# Altium footprint library 7-Connectors-7.PcbLib: 35 footprints (part 3 of 4)
Each footprint in its own frame and in the unit in brackets; x right, y up, seen from the top. Pads: shape width x height; smd on the part's side, far side on the other; paste and mask are expansions set on the pad; w line width, h text height; cw(c..) or ccw(c..) is an arc to the next point about the centre after c.
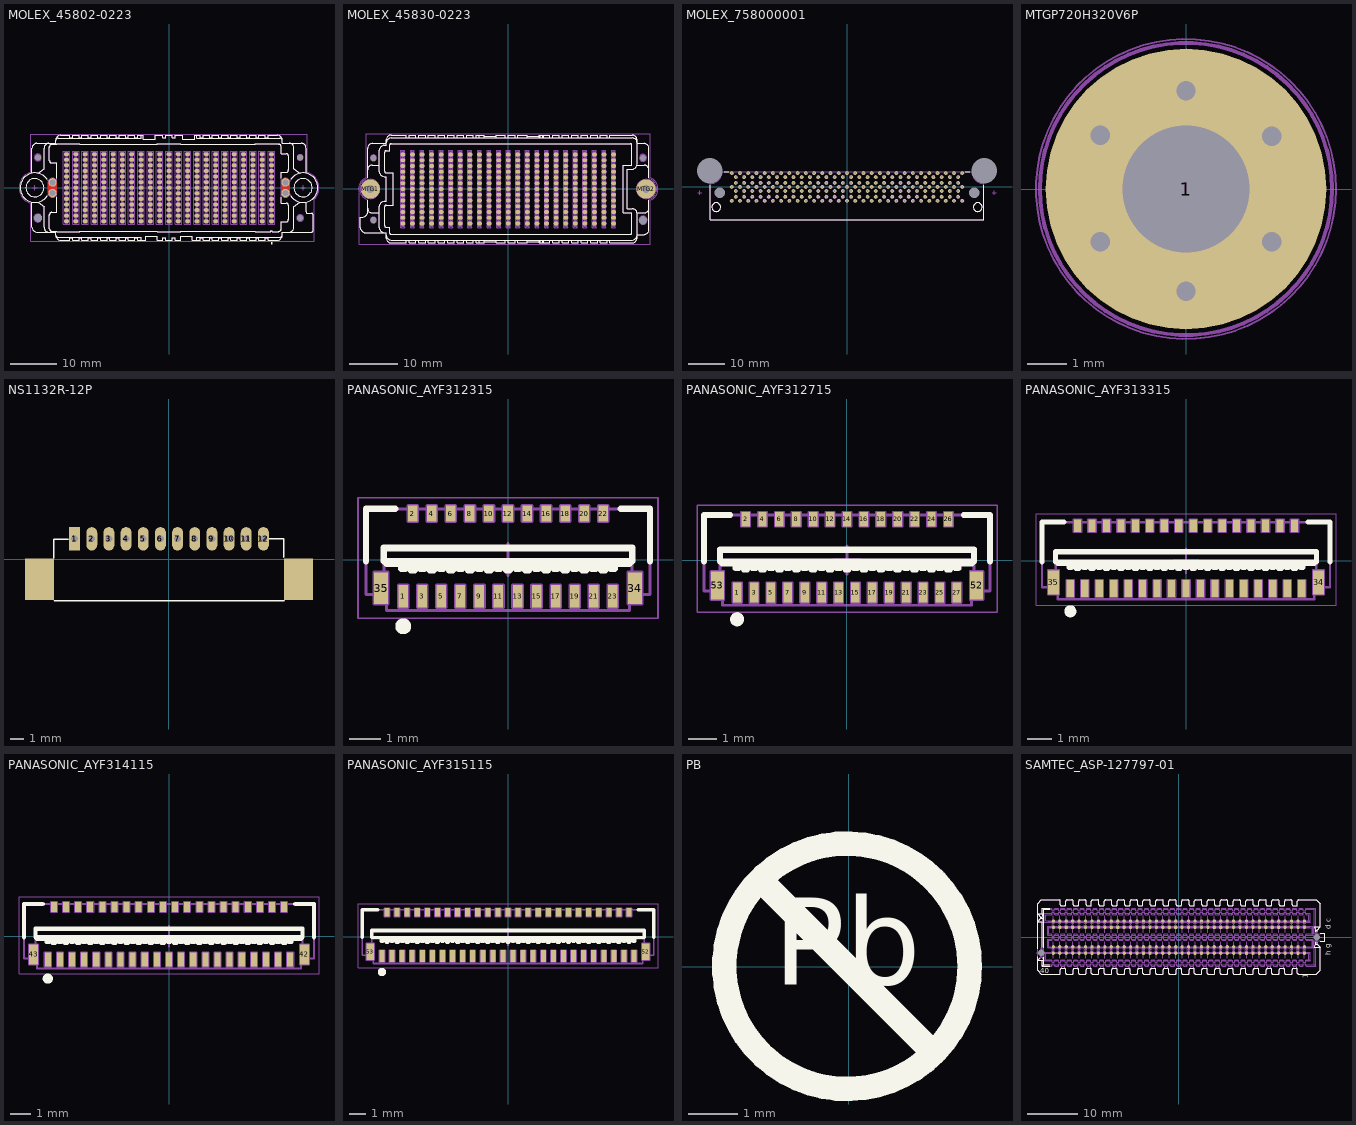
[diagram p2: the footprints below, top view; thin cyan lines are the x and y axes]

## MOLEX_45802-0223 [mm] "1.20mm by 2.00mm Pitch HD Mezzanine Receptacle, 299 Circuits, 8.00mm Unmated Height, 23 Rows"
height 10.51
pads (307):
  rrect100% 1x0.8 smd: 1A(22,-7.2) 1B(22,-6) 1C(22,-4.8) 1D(22,-3.6) 1E(22,-2.4) 1F(22,-1.2) 1G(22,0) 1H(22,1.2) 1I(22,2.4) 1J(22,3.6) 1K(22,4.8) 1L(22,6) 1M(22,7.2) 2A(20,-7.2) 2B(20,-6) 2C(20,-4.8) 2D(20,-3.6) 2E(20,-2.4) 2F(20,-1.2) 2G(20,0) 2H(20,1.2) 2I(20,2.4) 2J(20,3.6) 2K(20,4.8) 2L(20,6) 2M(20,7.2) 3A(18,-7.2) 3B(18,-6) 3C(18,-4.8) 3D(18,-3.6) 3E(18,-2.4) 3F(18,-1.2) 3G(18,0) 3H(18,1.2) 3I(18,2.4) 3J(18,3.6) 3K(18,4.8) 3L(18,6) 3M(18,7.2) 4A(16,-7.2) 4B(16,-6) 4C(16,-4.8) 4D(16,-3.6) 4E(16,-2.4) 4F(16,-1.2) 4G(16,0) 4H(16,1.2) 4I(16,2.4) 4J(16,3.6) 4K(16,4.8) 4L(16,6) 4M(16,7.2) 5A(14,-7.2) 5B(14,-6) 5C(14,-4.8) 5D(14,-3.6) 5E(14,-2.4) 5F(14,-1.2) 5G(14,0) 5H(14,1.2) 5I(14,2.4) 5J(14,3.6) 5K(14,4.8) 5L(14,6) 5M(14,7.2) 6A(12,-7.2) 6B(12,-6) 6C(12,-4.8) 6D(12,-3.6) 6E(12,-2.4) 6F(12,-1.2) 6G(12,0) 6H(12,1.2) 6I(12,2.4) 6J(12,3.6) 6K(12,4.8) 6L(12,6) 6M(12,7.2) 7A(10,-7.2) 7B(10,-6) 7C(10,-4.8) 7D(10,-3.6) 7E(10,-2.4) 7F(10,-1.2) 7G(10,0) 7H(10,1.2) 7I(10,2.4) 7J(10,3.6) 7K(10,4.8) 7L(10,6) 7M(10,7.2) 8A(8,-7.2) 8B(8,-6) 8C(8,-4.8) 8D(8,-3.6) 8E(8,-2.4) 8F(8,-1.2) 8G(8,0) 8H(8,1.2) 8I(8,2.4) 8J(8,3.6) 8K(8,4.8) 8L(8,6) 8M(8,7.2) 9A(6,-7.2) 9B(6,-6) 9C(6,-4.8) 9D(6,-3.6) 9E(6,-2.4) 9F(6,-1.2) 9G(6,0) 9H(6,1.2) 9I(6,2.4) 9J(6,3.6) 9K(6,4.8) 9L(6,6) 9M(6,7.2) 10A(4,-7.2) 10B(4,-6) 10C(4,-4.8) 10D(4,-3.6) 10E(4,-2.4) 10F(4,-1.2) 10G(4,0) 10H(4,1.2) 10I(4,2.4) 10J(4,3.6) 10K(4,4.8) 10L(4,6) 10M(4,7.2) 11A(2,-7.2) 11B(2,-6) 11C(2,-4.8) 11D(2,-3.6) 11E(2,-2.4) 11F(2,-1.2) 11G(2,0) 11H(2,1.2) 11I(2,2.4) 11J(2,3.6) 11K(2,4.8) 11L(2,6) 11M(2,7.2) 12A(0,-7.2) 12B(0,-6) 12C(0,-4.8) 12D(0,-3.6) 12E(0,-2.4) 12F(0,-1.2) 12G(0,0) 12H(0,1.2) 12I(0,2.4) 12J(0,3.6) 12K(0,4.8) 12L(0,6) 12M(0,7.2) 13A(-2,-7.2) 13B(-2,-6) 13C(-2,-4.8) 13D(-2,-3.6) 13E(-2,-2.4) 13F(-2,-1.2) 13G(-2,0) 13H(-2,1.2) 13I(-2,2.4) 13J(-2,3.6) 13K(-2,4.8) 13L(-2,6) 13M(-2,7.2) 14A(-4,-7.2) 14B(-4,-6) 14C(-4,-4.8) 14D(-4,-3.6) 14E(-4,-2.4) 14F(-4,-1.2) 14G(-4,0) 14H(-4,1.2) 14I(-4,2.4) 14J(-4,3.6) 14K(-4,4.8) 14L(-4,6) 14M(-4,7.2) 15A(-6,-7.2) 15B(-6,-6) 15C(-6,-4.8) 15D(-6,-3.6) 15E(-6,-2.4) 15F(-6,-1.2) 15G(-6,0) 15H(-6,1.2) 15I(-6,2.4) 15J(-6,3.6) 15K(-6,4.8) 15L(-6,6) 15M(-6,7.2) 16A(-8,-7.2) 16B(-8,-6) 16C(-8,-4.8) 16D(-8,-3.6) 16E(-8,-2.4) 16F(-8,-1.2) 16G(-8,0) 16H(-8,1.2) 16I(-8,2.4) 16J(-8,3.6) 16K(-8,4.8) 16L(-8,6) 16M(-8,7.2) 17A(-10,-7.2) 17B(-10,-6) 17C(-10,-4.8) 17D(-10,-3.6) 17E(-10,-2.4) 17F(-10,-1.2) 17G(-10,0) 17H(-10,1.2) 17I(-10,2.4) 17J(-10,3.6) 17K(-10,4.8) 17L(-10,6) 17M(-10,7.2) 18A(-12,-7.2) 18B(-12,-6) 18C(-12,-4.8) 18D(-12,-3.6) 18E(-12,-2.4) 18F(-12,-1.2) 18G(-12,0) 18H(-12,1.2) 18I(-12,2.4) 18J(-12,3.6) 18K(-12,4.8) 18L(-12,6) 18M(-12,7.2) 19A(-14,-7.2) 19B(-14,-6) 19C(-14,-4.8) 19D(-14,-3.6) 19E(-14,-2.4) 19F(-14,-1.2) 19G(-14,0) 19H(-14,1.2) 19I(-14,2.4) 19J(-14,3.6) 19K(-14,4.8) 19L(-14,6) 19M(-14,7.2) 20A(-16,-7.2) 20B(-16,-6) 20C(-16,-4.8) 20D(-16,-3.6) 20E(-16,-2.4) 20F(-16,-1.2) 20G(-16,0) 20H(-16,1.2) 20I(-16,2.4) 20J(-16,3.6) 20K(-16,4.8) 20L(-16,6) 20M(-16,7.2) 21A(-18,-7.2) 21B(-18,-6) 21C(-18,-4.8) 21D(-18,-3.6) 21E(-18,-2.4) 21F(-18,-1.2) 21G(-18,0) 21H(-18,1.2) 21I(-18,2.4) 21J(-18,3.6) 21K(-18,4.8) 21L(-18,6) 21M(-18,7.2) 22A(-20,-7.2) 22B(-20,-6) 22C(-20,-4.8) 22D(-20,-3.6) 22E(-20,-2.4) 22F(-20,-1.2) 22G(-20,0) 22H(-20,1.2) 22I(-20,2.4) 22J(-20,3.6) 22K(-20,4.8) 22L(-20,6) 22M(-20,7.2) 23A(-22,-7.2) 23B(-22,-6) 23C(-22,-4.8) 23D(-22,-3.6) 23E(-22,-2.4) 23F(-22,-1.2) 23G(-22,0) 23H(-22,1.2) 23I(-22,2.4) 23J(-22,3.6) 23K(-22,4.8) 23L(-22,6) 23M(-22,7.2)
  round 1 hole 1.75 unplated mask+0.375: MTG1(-28.15,-6.5)
  round 1 hole 1.25 unplated mask+0.125: MTG2(-28.15,6.5) MTG3(28.15,6.5) MTG4(28.15,-6.5)
  round 1.8 hole 1.3: MTG5(-25,1.15) MTG6(-25,-1.15) MTG7(25,1.15) MTG8(25,-1.15)
Top Layer:
  region: 24.1,-1.15 24.1,1.15 24.1,1.268 24.161,1.497 24.28,1.703 24.447,1.87 24.653,1.989 24.882,2.05 25.118,2.05 25.347,1.989 25.553,1.87 25.72,1.703 25.839,1.497 25.9,1.268 25.9,1.15 25.9,-1.15 25.9,-1.268 25.839,-1.497 25.72,-1.703 25.553,-1.87 25.347,-1.989 25.118,-2.05 24.882,-2.05 24.653,-1.989 24.447,-1.87 24.28,-1.703 24.161,-1.497 24.1,-1.268
  region: -25.9,-1.15 -25.9,1.15 -25.9,1.268 -25.839,1.497 -25.72,1.703 -25.553,1.87 -25.347,1.989 -25.119,2.05 -24.882,2.05 -24.653,1.989 -24.447,1.87 -24.28,1.703 -24.161,1.497 -24.1,1.268 -24.1,1.15 -24.1,-1.15 -24.1,-1.268 -24.161,-1.497 -24.28,-1.703 -24.447,-1.87 -24.653,-1.989 -24.882,-2.05 -25.119,-2.05 -25.347,-1.989 -25.553,-1.87 -25.72,-1.703 -25.839,-1.497 -25.9,-1.268
Bottom Layer:
  region: 24.1,-1.15 24.1,1.15 24.1,1.268 24.161,1.497 24.28,1.703 24.447,1.87 24.653,1.989 24.882,2.05 25.118,2.05 25.347,1.989 25.553,1.87 25.72,1.703 25.839,1.497 25.9,1.268 25.9,1.15 25.9,-1.15 25.9,-1.268 25.839,-1.497 25.72,-1.703 25.553,-1.87 25.347,-1.989 25.118,-2.05 24.882,-2.05 24.653,-1.989 24.447,-1.87 24.28,-1.703 24.161,-1.497 24.1,-1.268
  region: -25.9,-1.15 -25.9,1.15 -25.9,1.268 -25.839,1.497 -25.72,1.703 -25.553,1.87 -25.347,1.989 -25.119,2.05 -24.882,2.05 -24.653,1.989 -24.447,1.87 -24.28,1.703 -24.161,1.497 -24.1,1.268 -24.1,1.15 -24.1,-1.15 -24.1,-1.268 -24.161,-1.497 -24.28,-1.703 -24.447,-1.87 -24.653,-1.989 -24.882,-2.05 -25.119,-2.05 -25.347,-1.989 -25.553,-1.87 -25.72,-1.703 -25.839,-1.497 -25.9,-1.268
Top Overlay:
  drawing of 357 lines, arcs and shapes, not listed
Mechanical 8:
  drawing of 2456 lines, arcs and shapes, not listed
Mechanical 14:
  drawing of 495 lines, arcs and shapes, not listed
Mechanical 15:
  lines w0.05: -29.665,-11.5 -29.665,-3.302 cw(c-28.775,0) -29.665,3.302 -29.665,11.5 29.665,11.5 29.665,3.302 cw(c28.775,0) 31.165,-2.446 31.165,-11.5 -29.665,-11.5
3D body "MOLEX_45802-0223.stp": height 10.51, standoff -1.99, extent -31.945,-11.25 31.945,11.25

## MOLEX_45830-0223 [mm] "1.20mm by 2.00mm Pitch HD Mezzanine Plug, 299 Circuits, 8.00mm Unmated Height, 23 Rows"
height 10.41
pads (305):
  rrect100% 1x0.8 smd: 1A(-22,-7.2) 1B(-22,-6) 1C(-22,-4.8) 1D(-22,-3.6) 1E(-22,-2.4) 1F(-22,-1.2) 1G(-22,0) 1H(-22,1.2) 1I(-22,2.4) 1J(-22,3.6) 1K(-22,4.8) 1L(-22,6) 1M(-22,7.2) 2A(-20,-7.2) 2B(-20,-6) 2C(-20,-4.8) 2D(-20,-3.6) 2E(-20,-2.4) 2F(-20,-1.2) 2G(-20,0) 2H(-20,1.2) 2I(-20,2.4) 2J(-20,3.6) 2K(-20,4.8) 2L(-20,6) 2M(-20,7.2) 3A(-18,-7.2) 3B(-18,-6) 3C(-18,-4.8) 3D(-18,-3.6) 3E(-18,-2.4) 3F(-18,-1.2) 3G(-18,0) 3H(-18,1.2) 3I(-18,2.4) 3J(-18,3.6) 3K(-18,4.8) 3L(-18,6) 3M(-18,7.2) 4A(-16,-7.2) 4B(-16,-6) 4C(-16,-4.8) 4D(-16,-3.6) 4E(-16,-2.4) 4F(-16,-1.2) 4G(-16,0) 4H(-16,1.2) 4I(-16,2.4) 4J(-16,3.6) 4K(-16,4.8) 4L(-16,6) 4M(-16,7.2) 5A(-14,-7.2) 5B(-14,-6) 5C(-14,-4.8) 5D(-14,-3.6) 5E(-14,-2.4) 5F(-14,-1.2) 5G(-14,0) 5H(-14,1.2) 5I(-14,2.4) 5J(-14,3.6) 5K(-14,4.8) 5L(-14,6) 5M(-14,7.2) 6A(-12,-7.2) 6B(-12,-6) 6C(-12,-4.8) 6D(-12,-3.6) 6E(-12,-2.4) 6F(-12,-1.2) 6G(-12,0) 6H(-12,1.2) 6I(-12,2.4) 6J(-12,3.6) 6K(-12,4.8) 6L(-12,6) 6M(-12,7.2) 7A(-10,-7.2) 7B(-10,-6) 7C(-10,-4.8) 7D(-10,-3.6) 7E(-10,-2.4) 7F(-10,-1.2) 7G(-10,0) 7H(-10,1.2) 7I(-10,2.4) 7J(-10,3.6) 7K(-10,4.8) 7L(-10,6) 7M(-10,7.2) 8A(-8,-7.2) 8B(-8,-6) 8C(-8,-4.8) 8D(-8,-3.6) 8E(-8,-2.4) 8F(-8,-1.2) 8G(-8,0) 8H(-8,1.2) 8I(-8,2.4) 8J(-8,3.6) 8K(-8,4.8) 8L(-8,6) 8M(-8,7.2) 9A(-6,-7.2) 9B(-6,-6) 9C(-6,-4.8) 9D(-6,-3.6) 9E(-6,-2.4) 9F(-6,-1.2) 9G(-6,0) 9H(-6,1.2) 9I(-6,2.4) 9J(-6,3.6) 9K(-6,4.8) 9L(-6,6) 9M(-6,7.2) 10A(-4,-7.2) 10B(-4,-6) 10C(-4,-4.8) 10D(-4,-3.6) 10E(-4,-2.4) 10F(-4,-1.2) 10G(-4,0) 10H(-4,1.2) 10I(-4,2.4) 10J(-4,3.6) 10K(-4,4.8) 10L(-4,6) 10M(-4,7.2) 11A(-2,-7.2) 11B(-2,-6) 11C(-2,-4.8) 11D(-2,-3.6) 11E(-2,-2.4) 11F(-2,-1.2) 11G(-2,0) 11H(-2,1.2) 11I(-2,2.4) 11J(-2,3.6) 11K(-2,4.8) 11L(-2,6) 11M(-2,7.2) 12A(0,-7.2) 12B(0,-6) 12C(0,-4.8) 12D(0,-3.6) 12E(0,-2.4) 12F(0,-1.2) 12G(0,0) 12H(0,1.2) 12I(0,2.4) 12J(0,3.6) 12K(0,4.8) 12L(0,6) 12M(0,7.2) 13A(2,-7.2) 13B(2,-6) 13C(2,-4.8) 13D(2,-3.6) 13E(2,-2.4) 13F(2,-1.2) 13G(2,0) 13H(2,1.2) 13I(2,2.4) 13J(2,3.6) 13K(2,4.8) 13L(2,6) 13M(2,7.2) 14A(4,-7.2) 14B(4,-6) 14C(4,-4.8) 14D(4,-3.6) 14E(4,-2.4) 14F(4,-1.2) 14G(4,0) 14H(4,1.2) 14I(4,2.4) 14J(4,3.6) 14K(4,4.8) 14L(4,6) 14M(4,7.2) 15A(6,-7.2) 15B(6,-6) 15C(6,-4.8) 15D(6,-3.6) 15E(6,-2.4) 15F(6,-1.2) 15G(6,0) 15H(6,1.2) 15I(6,2.4) 15J(6,3.6) 15K(6,4.8) 15L(6,6) 15M(6,7.2) 16A(8,-7.2) 16B(8,-6) 16C(8,-4.8) 16D(8,-3.6) 16E(8,-2.4) 16F(8,-1.2) 16G(8,0) 16H(8,1.2) 16I(8,2.4) 16J(8,3.6) 16K(8,4.8) 16L(8,6) 16M(8,7.2) 17A(10,-7.2) 17B(10,-6) 17C(10,-4.8) 17D(10,-3.6) 17E(10,-2.4) 17F(10,-1.2) 17G(10,0) 17H(10,1.2) 17I(10,2.4) 17J(10,3.6) 17K(10,4.8) 17L(10,6) 17M(10,7.2) 18A(12,-7.2) 18B(12,-6) 18C(12,-4.8) 18D(12,-3.6) 18E(12,-2.4) 18F(12,-1.2) 18G(12,0) 18H(12,1.2) 18I(12,2.4) 18J(12,3.6) 18K(12,4.8) 18L(12,6) 18M(12,7.2) 19A(14,-7.2) 19B(14,-6) 19C(14,-4.8) 19D(14,-3.6) 19E(14,-2.4) 19F(14,-1.2) 19G(14,0) 19H(14,1.2) 19I(14,2.4) 19J(14,3.6) 19K(14,4.8) 19L(14,6) 19M(14,7.2) 20A(16,-7.2) 20B(16,-6) 20C(16,-4.8) 20D(16,-3.6) 20E(16,-2.4) 20F(16,-1.2) 20G(16,0) 20H(16,1.2) 20I(16,2.4) 20J(16,3.6) 20K(16,4.8) 20L(16,6) 20M(16,7.2) 21A(18,-7.2) 21B(18,-6) 21C(18,-4.8) 21D(18,-3.6) 21E(18,-2.4) 21F(18,-1.2) 21G(18,0) 21H(18,1.2) 21I(18,2.4) 21J(18,3.6) 21K(18,4.8) 21L(18,6) 21M(18,7.2) 22A(20,-7.2) 22B(20,-6) 22C(20,-4.8) 22D(20,-3.6) 22E(20,-2.4) 22F(20,-1.2) 22G(20,0) 22H(20,1.2) 22I(20,2.4) 22J(20,3.6) 22K(20,4.8) 22L(20,6) 22M(20,7.2) 23A(22,-7.2) 23B(22,-6) 23C(22,-4.8) 23D(22,-3.6) 23E(22,-2.4) 23F(22,-1.2) 23G(22,0) 23H(22,1.2) 23I(22,2.4) 23J(22,3.6) 23K(22,4.8) 23L(22,6) 23M(22,7.2)
  round 4 hole 1.75: MTG1(-28.775,0) MTG2(28.775,0)
  round 1 hole 1.25 unplated mask+0.125: MTG3(-28.15,-6.5) MTG5(-28.15,6.5) MTG6(28.15,6.5)
  round 1 hole 1.75 unplated mask+0.375: MTG4(28.15,-6.5)
Top Overlay:
  drawing of 245 lines, arcs and shapes, not listed
Mechanical 8:
  drawing of 2424 lines, arcs and shapes, not listed
Mechanical 14:
  drawing of 528 lines, arcs and shapes, not listed
Mechanical 15:
  lines w0.05: -31.115,-11.5 29.615,-11.5 29.615,-2.392 ccw(c28.73,0) 29.615,2.392 29.615,11.5 -29.615,11.5 -29.615,2.391 ccw(c-28.73,0) -31.115,-0.902 -31.115,-11.5
3D body "MOLEX_45830-0223.stp": height 13.35, standoff -1.99, extent -31.075,-11.25 31.075,11.25

## MOLEX_758000001 [mm] "0.75mm (.030\") Pitch Advanced Mezzanine Card Connector, B+ Style, Right Angle, 170 Circuit, 0.76祄 (30?) Gold (Au), Standard Height, with PCB Locator, Tin (Sn) Tail Plating"
height 21.85
pads (204):
  round 1 hole 2.9 unplated mask+1.1: 171(-34.77,-1.6) 172(34.77,-1.6)
  round 1 hole 7 unplated mask+3.2: 173(-37.5,4.4) 174(37.5,4.4)
  round 1 hole 0.5: B1(31.5,-3.8) B2(30.375,-2.7) B3(30.375,-1.1) B4(29.25,-3.8) B5(28.125,-2.7) B6(28.125,-1.1) B7(27,-3.8) B8(25.875,-2.7) B9(25.875,-1.1) B10(24.75,-3.8) B10(24.75,-3.8) B11(23.625,-2.7) B12(23.625,-1.1) B13(22.5,-3.8) B14(21.375,-2.7) B15(21.375,-1.1) B16(20.25,-3.8) B17(19.125,-2.7) B18(19.125,-1.1) B19(18,-3.8) B20(16.875,-2.7) B21(16.875,-1.1) B22(15.75,-3.8) B23(14.625,-2.7) B24(14.625,-1.1) B25(13.5,-3.8) B26(12.375,-2.7) B27(12.375,-1.1) B28(11.25,-3.8) B29(10.125,-2.7) B30(10.125,-1.1) B31(9,-3.8) B32(7.875,-2.7) B33(7.875,-1.1) B34(6.75,-3.8) B35(5.625,-2.7) B36(5.625,-1.1) B37(4.5,-3.8) B38(3.375,-2.7) B39(3.375,-1.1) B40(2.25,-3.8) B41(1.125,-2.7) B42(1.125,-1.1) B43(0,-3.8) B44(-1.125,-2.7) B45(-1.125,-1.1) B46(-2.25,-3.8) B47(-3.375,-2.7) B48(-3.375,-1.1) B49(-4.5,-3.8) B50(-5.625,-2.7) B51(-5.625,-1.1) B52(-6.75,-3.8) B53(-7.875,-2.7) B54(-7.875,-1.1) B55(-9,-3.8) B56(-10.125,-2.7) B57(-10.125,-1.1) B58(-11.25,-3.8) B59(-12.375,-2.7) B60(-12.375,-1.1) B61(-13.5,-3.8) B62(-14.625,-2.7) B63(-14.625,-1.1) B64(-15.75,-3.8) B65(-16.875,-2.7) B66(-16.875,-1.1) B67(-18,-3.8) B68(-19.125,-2.7) B69(-19.125,-1.1) B70(-20.25,-3.8) B71(-21.375,-2.7) B72(-21.375,-1.1) B73(-22.5,-3.8) B74(-23.625,-2.7) B75(-23.625,-1.1) B76(-24.75,-3.8) B77(-25.875,-2.7) B78(-25.875,-1.1) B79(-27,-3.8) B80(-28.125,-2.7) B81(-28.125,-1.1) B82(-29.25,-3.8) B83(-30.375,-2.7) B84(-30.375,-1.1) B85(-31.5,-3.8) B86(-31.5,0) B87(-30.375,2.7) B88(-30.375,1.1) B89(-29.25,0) B90(-28.125,2.7) B91(-28.125,1.1) B92(-27,0) B93(-25.875,2.7) B94(-25.875,1.1) B95(-24.75,0) B96(-23.625,2.7) B97(-23.625,1.1) B98(-22.5,0) B99(-21.375,2.7) B100(-21.375,1.1) B101(-20.25,0) B102(-19.125,2.7) B103(-19.125,1.1) B104(-18,0) B105(-16.875,2.7) B106(-16.875,1.1) B107(-15.75,0) B108(-14.625,2.7) B109(-14.625,1.1) B110(-13.5,0) B111(-12.375,2.7) B112(-12.375,1.1) B113(-11.25,0) B114(-10.125,2.7) B115(-10.125,1.1) B116(-9,0) B117(-7.875,2.7) B118(-7.875,1.1) B119(-6.75,0) B120(-5.625,2.7) B121(-5.625,1.1) B122(-4.5,0) B123(-3.375,2.7) B124(-3.375,1.1) B125(-2.25,0) B126(-1.125,2.7) B127(-1.125,1.1) B128(0,0) B129(1.125,2.7) B130(1.125,1.1) B131(2.25,0) B132(3.375,2.7) B133(3.375,1.1) B134(4.5,0) B135(5.625,2.7) B136(5.625,1.1) B137(6.75,0) B138(7.875,2.7) B139(7.875,1.1) B140(9,0) B141(10.125,2.7) B142(10.125,1.1) B143(11.25,0) B144(12.375,2.7) B145(12.375,1.1) B146(13.5,0) B147(14.625,2.7) B148(14.625,1.1) B149(15.75,0) B150(16.875,2.7) B151(16.875,1.1) B152(18,0) B153(19.125,2.7) B154(19.125,1.1) B155(20.25,0) B156(21.375,2.7) B157(21.375,1.1) B158(22.5,0) B159(23.625,2.7) B160(23.625,1.1) B161(24.75,0) B162(25.875,2.7) B163(25.875,1.1) B164(27,0) B165(28.125,2.7) B166(28.125,1.1) B167(29.25,0) B168(30.375,2.7) B169(30.375,1.1) B170(31.5,0) Shie(-27,3.8) Shie(-24.75,3.8) Shie(-22.5,3.8) Shie(-20.25,3.8) Shie(-18,3.8) Shie(-15.75,3.8) Shie(-13.5,3.8) Shie(-11.25,3.8) Shie(-9,3.8) Shie(-6.75,3.8) Shie(-4.5,3.8) Shie(-2.25,3.8) Shie(0,3.8) Shie(2.25,3.8) Shie(4.5,3.8) Shie(6.75,3.8) Shie(9,3.8) Shie(11.25,3.8) Shie(13.5,3.8) Shie(15.75,3.8) Shie(18,3.8) Shie(20.25,3.8) Shie(22.5,3.8) Shie(24.75,3.8) Shie(27,3.8) Shie(29.25,3.8) Shie(31.5,3.8) Shield(-31.5,3.8) Shield(-29.25,3.8)
Top Overlay:
  circle w0.2: c-35.75,-5.52 r1.2
  circle w0.2: c35.75,-5.52 r1.2
  lines w0.2: -37.4,0.501 -37.4,-9.02 37.4,-9.02 37.4,0.501 ; -33.61,4.12 -32.341,4.12 ; 32.341,4.12 33.61,4.12
Mechanical 8:
  drawing of 820 lines, arcs and shapes, not listed
Mechanical 14:
  circle w0.1: c-35.75,-5.52 r1.2
  circle w0.1: c35.75,-5.52 r1.2
  lines w0.1: -37.4,0.901 ccw(c-37.5,4.4) -34.011,4.12 ; 34.011,4.12 ccw(c37.5,4.4) 37.4,0.901 ; -37.4,1.957 ccw(c-37.5,4.38) -35.089,4.12 ; -37.4,1.957 -37.4,-9.02 37.4,-9.02 37.4,1.957 ; -37.4,1.957 -37.4,3.184 ccw(c-37.5,4.38) -37.4,5.576 -37.4,7.605 cw(c-37.5,4.38) -34.284,4.12 -35.089,4.12 ; -35.089,4.12 35.089,4.12 ; 35.089,4.12 ccw(c37.5,4.38) 37.4,1.957 ; 35.089,4.12 34.284,4.12 cw(c37.5,4.38) 37.4,7.605 37.4,5.576 ccw(c37.5,4.38) 37.4,3.184 37.4,1.957
Drill Drawing:
  lines w0.2: -32.625,-5.062 -32.625,5.062 32.625,5.062 32.625,-5.062 -32.625,-5.062
  text "PRESS-FIT TECHNOLOGY diam. 0.45mm +0.06/-0.04" at -18,-6.75 h1
3D body "MOLEX_758000-001.stp": height 22.35, standoff -5.8, extent -37.4,-9.02 37.4,7.605

## MTGP720H320V6P [mm]
pads (1):
  round 7.2 hole 3.25: 1(0,0)
via -2.2,-1.35 diameter 1 hole 0.5
via -2.2,1.375 diameter 1 hole 0.5
via 0,2.525 diameter 1 hole 0.5
via 2.2,1.35 diameter 1 hole 0.5
via 0,-2.625 diameter 1 hole 0.5
via 2.2,-1.35 diameter 1 hole 0.5
Mechanical 8:
  circle w0.1: c0,0 r2.6
  circle w0.1: c0,0 r3.75
  lines w0.1: -2.657,1.625 -2.224,1.375 ; -2.632,-1.6 -2.199,-1.35 ; -2.474,0.942 -2.224,1.375 ; -2.449,-0.917 -2.199,-1.35 ; -1.974,1.808 -2.224,1.375 ; -1.949,-1.783 -2.199,-1.35 ; -1.791,1.125 -2.224,1.375 ; -1.766,-1.1 -2.199,-1.35 ; -0.5,-2.625 0,-2.625 ; -0.5,0 0,0 ; -0.5,2.525 0,2.525 ; 0,-3.125 0,-2.625 ; 0,-2.125 0,-2.625 ; 0,-0.5 0,0 ; 0,0.5 0,0 ; 0,2.025 0,2.525 ; 0,3.025 0,2.525 ; 0.5,-2.625 0,-2.625 ; 0.5,0 0,0 ; 0.5,2.525 0,2.525 ; 1.766,-1.1 2.199,-1.35 ; 1.766,1.1 2.199,1.35 ; 1.949,-1.783 2.199,-1.35 ; 1.949,1.783 2.199,1.35 ; 2.449,-0.917 2.199,-1.35 ; 2.449,0.917 2.199,1.35 ; 2.632,-1.6 2.199,-1.35 ; 2.632,1.6 2.199,1.35
Mechanical 14:
  circle w0.1: c0,0 r3.75
Mechanical 15:
  circle w0.05: c0,0 r3.85
3D body "mtgp720h320v6p.stp": height 0.1, standoff -1.75, extent -3.627,-3.627 3.628,3.628

## NS1132R-12P [mm]
height 8.4
pads (26):
  rect 0.7x0.7 hole 0.5 mask+0.07: 1(-6.875,1.475)
  rect 0.8x1.7 smd mask+0.07: 1(-6.875,1.475)
  round 0.7 hole 0.5 mask+0.07: 2(-5.625,1.475) 3(-4.375,1.475) 4(-3.125,1.475) 5(-1.875,1.475) 6(-0.625,1.475) 7(0.625,1.475) 8(1.875,1.475) 9(3.125,1.475) 10(4.375,1.475) 11(5.625,1.475) 12(6.875,1.475)
  oval 0.8x1.7 smd mask+0.07: 2(-5.625,1.475) 3(-4.375,1.475) 4(-3.125,1.475) 5(-1.875,1.475) 6(-0.625,1.475) 7(0.625,1.475) 8(1.875,1.475) 9(3.125,1.475) 10(4.375,1.475) 11(5.625,1.475)
  oval 0.8x1.7 smd: 12(6.875,1.475)
  rect 2.1x3 smd mask+0.07: ""(-9.425,-1.475) ""(9.425,-1.475)
Top Overlay:
  lines w0.127: -8.399,0.053 -8.399,1.45 -7.358,1.45 ; -8.348,-3.046 8.402,-3.046 ; 7.324,1.475 8.34,1.475 ; 8.365,0.129 8.365,1.45
3D body "ns1132smt.stp": height 3.2, standoff 0, extent -9.487,-3.213 9.513,1.987
3D body "p170-080.stp": height 0.02, standoff 0, extent -7.275,0.625 -6.475,2.325
3D body "p170-080.stp": height 0.02, standoff 0, extent -6.025,0.625 -5.225,2.325
3D body "p170-080.stp": height 0.02, standoff 0, extent -4.775,0.625 -3.975,2.325
3D body "p170-080.stp": height 0.02, standoff 0, extent -3.525,0.625 -2.725,2.325
3D body "p170-080.stp": height 0.02, standoff 0, extent -2.275,0.625 -1.475,2.325
3D body "p170-080.stp": height 0.02, standoff 0, extent -1.025,0.625 -0.225,2.325
3D body "p170-080.stp": height 0.02, standoff 0, extent 0.225,0.625 1.025,2.325
3D body "p170-080.stp": height 0.02, standoff 0, extent 1.475,0.625 2.275,2.325
3D body "p170-080.stp": height 0.02, standoff 0, extent 2.725,0.625 3.525,2.325
3D body "p170-080.stp": height 0.02, standoff 0, extent 3.975,0.625 4.775,2.325
3D body "p170-080.stp": height 0.02, standoff 0, extent 5.225,0.625 6.025,2.325
3D body "p170-080.stp": height 0.02, standoff 0, extent 6.475,0.625 7.275,2.325
3D body "p300-210.stp": height 0.02, standoff 0, extent 8.375,-2.975 10.475,0.025
3D body "p300-210.stp": height 0.02, standoff 0, extent -10.475,-2.975 -8.375,0.025

## PANASONIC_AYF312315 [mm] "23 Contacts, Pitch 0.3mm, Surface Mount, FPC for FPC Connection, YF31 Serie"
height 0.91
pads (25):
  rect 0.3x0.7 smd: 1(-3.3,-1.15) 3(-2.7,-1.15) 5(-2.1,-1.15) 7(-1.5,-1.15) 9(-0.9,-1.15) 11(-0.3,-1.15) 13(0.3,-1.15) 15(0.9,-1.15) 17(1.5,-1.15) 19(2.1,-1.15) 21(2.7,-1.15) 23(3.3,-1.15)
  rect 0.3x0.5 smd: 2(-3,1.45) 4(-2.4,1.45) 6(-1.8,1.45) 8(-1.2,1.45) 10(-0.6,1.45) 12(0,1.45) 14(0.6,1.45) 16(1.2,1.45) 18(1.8,1.45) 20(2.4,1.45) 22(3,1.45)
  rect 0.45x1 smd: 34(4,-0.9) 35(-4,-0.9)
Top Overlay:
  circle w0.25: c-3.3,-2.1 r0.125
  lines w0.2: -4.475,-0.05 -4.475,1.6 -3.55,1.6 ; -3.91,0.35 3.91,0.35 ; -3.825,-0.05 -3.825,-0.129 -3.36,-0.129 ; -3.36,-0.05 -3.36,-0.283 -3.24,-0.283 -3.24,-0.05 ; -3.24,-0.129 -3.06,-0.129 ; -3.06,-0.05 -3.06,-0.332 -2.94,-0.332 -2.94,-0.05 ; -2.94,-0.129 -2.76,-0.129 ; -2.76,-0.05 -2.76,-0.283 -2.64,-0.283 -2.64,-0.05 ; -2.64,-0.129 -2.46,-0.129 ; -2.46,-0.05 -2.46,-0.332 -2.34,-0.332 -2.34,-0.05 ; -2.34,-0.129 -2.16,-0.129 ; -2.16,-0.05 -2.16,-0.283 -2.04,-0.283 -2.04,-0.05 ; -2.04,-0.129 -1.86,-0.129 ; -1.86,-0.05 -1.86,-0.332 -1.74,-0.332 -1.74,-0.05 ; -1.74,-0.129 -1.56,-0.129 ; -1.56,-0.05 -1.56,-0.283 -1.44,-0.283 -1.44,-0.05 ; -1.44,-0.129 -1.26,-0.129 ; -1.26,-0.05 -1.26,-0.332 -1.14,-0.332 -1.14,-0.05 ; -1.14,-0.129 -0.96,-0.129 ; -0.96,-0.05 -0.96,-0.283 -0.84,-0.283 -0.84,-0.05 ; -0.84,-0.129 -0.66,-0.129 ; -0.66,-0.05 -0.66,-0.332 -0.54,-0.332 -0.54,-0.05 ; -0.54,-0.129 -0.36,-0.129 ; -0.36,-0.05 -0.36,-0.283 -0.24,-0.283 -0.24,-0.05 ; -0.24,-0.129 -0.06,-0.129 ; -0.06,-0.05 -0.06,-0.332 0.06,-0.332 0.06,-0.05 ; 0.06,-0.129 0.24,-0.129 ; 0.24,-0.05 0.24,-0.283 0.36,-0.283 0.36,-0.05 ; 0.36,-0.129 0.54,-0.129 ; 0.54,-0.05 0.54,-0.332 0.66,-0.332 0.66,-0.05 ; 0.66,-0.129 0.84,-0.129 ; 0.84,-0.05 0.84,-0.283 0.96,-0.283 0.96,-0.05 ; 0.96,-0.129 1.14,-0.129 ; 1.14,-0.05 1.14,-0.332 1.26,-0.332 1.26,-0.05 ; 1.26,-0.129 1.44,-0.129 ; 1.44,-0.05 1.44,-0.283 1.56,-0.283 1.56,-0.05 ; 1.56,-0.129 1.74,-0.129 ; 1.74,-0.05 1.74,-0.332 1.86,-0.332 1.86,-0.05 ; 1.86,-0.129 2.04,-0.129 ; 2.04,-0.05 2.04,-0.283 2.16,-0.283 2.16,-0.05 ; 2.16,-0.129 2.34,-0.129 ; 2.34,-0.05 2.34,-0.332 2.46,-0.332 2.46,-0.05 ; 2.46,-0.129 2.64,-0.129 ; 2.64,-0.05 2.64,-0.283 2.76,-0.283 2.76,-0.05 ; 2.76,-0.129 2.94,-0.129 ; 2.94,-0.05 2.94,-0.332 3.06,-0.332 3.06,-0.05 ; 3.06,-0.129 3.24,-0.129 ; 3.24,-0.05 3.24,-0.283 3.36,-0.283 3.36,-0.05 ; 3.36,-0.129 3.825,-0.129 3.825,-0.05 ; 3.55,1.6 4.475,1.6 4.475,-0.05 ; -3.91,-0.05 3.91,-0.05 3.91,0.38 -3.91,0.38 -3.91,-0.05
Mechanical 8:
  lines w0.1: -4,-0.9 -4.225,-0.4 ; -3.3,-1.15 -3.15,-1.5 ; -3,1.45 -3.15,1.2 ; -2.7,-1.15 -2.55,-1.5 ; -2.4,1.45 -2.55,1.2 ; -2.1,-1.15 -1.95,-1.5 ; -1.8,1.45 -1.95,1.2 ; -1.5,-1.15 -1.35,-1.5 ; -1.2,1.45 -1.35,1.2 ; -0.9,-1.15 -0.75,-1.5 ; -0.6,1.45 -0.75,1.2 ; -0.5,0 0,0 ; -0.3,-1.15 -0.15,-1.5 ; 0,-0.5 0,0 ; 0,0.5 0,0 ; 0,1.45 -0.15,1.2 ; 0.3,-1.15 0.45,-1.5 ; 0.5,0 0,0 ; 0.6,1.45 0.45,1.2 ; 0.9,-1.15 1.05,-1.5 ; 1.2,1.45 1.05,1.2 ; 1.5,-1.15 1.65,-1.5 ; 1.8,1.45 1.65,1.2 ; 2.1,-1.15 2.25,-1.5 ; 2.4,1.45 2.25,1.2 ; 2.7,-1.15 2.85,-1.5 ; 3,1.45 2.85,1.2 ; 3.3,-1.15 3.45,-1.5 ; 4,-0.9 3.775,-0.4 ; -4.225,-0.4 -4.225,-1.4 -3.775,-1.4 -3.775,-0.4 -4.225,-0.4 ; -3.15,-1.5 -3.15,-0.8 -3.45,-0.8 -3.45,-1.5 -3.15,-1.5 ; -3.15,1.2 -3.15,1.7 -2.85,1.7 -2.85,1.2 -3.15,1.2 ; -2.55,-1.5 -2.55,-0.8 -2.85,-0.8 -2.85,-1.5 -2.55,-1.5 ; -2.55,1.2 -2.55,1.7 -2.25,1.7 -2.25,1.2 -2.55,1.2 ; -1.95,-1.5 -1.95,-0.8 -2.25,-0.8 -2.25,-1.5 -1.95,-1.5 ; -1.95,1.2 -1.95,1.7 -1.65,1.7 -1.65,1.2 -1.95,1.2 ; -1.35,-1.5 -1.35,-0.8 -1.65,-0.8 -1.65,-1.5 -1.35,-1.5 ; -1.35,1.2 -1.35,1.7 -1.05,1.7 -1.05,1.2 -1.35,1.2 ; -0.75,-1.5 -0.75,-0.8 -1.05,-0.8 -1.05,-1.5 -0.75,-1.5 ; -0.75,1.2 -0.75,1.7 -0.45,1.7 -0.45,1.2 -0.75,1.2 ; -0.15,-1.5 -0.15,-0.8 -0.45,-0.8 -0.45,-1.5 -0.15,-1.5 ; -0.15,1.2 -0.15,1.7 0.15,1.7 0.15,1.2 -0.15,1.2 ; 0.45,-1.5 0.45,-0.8 0.15,-0.8 0.15,-1.5 0.45,-1.5 ; 0.45,1.2 0.45,1.7 0.75,1.7 0.75,1.2 0.45,1.2 ; 1.05,-1.5 1.05,-0.8 0.75,-0.8 0.75,-1.5 1.05,-1.5 ; 1.05,1.2 1.05,1.7 1.35,1.7 1.35,1.2 1.05,1.2 ; 1.65,-1.5 1.65,-0.8 1.35,-0.8 1.35,-1.5 1.65,-1.5 ; 1.65,1.2 1.65,1.7 1.95,1.7 1.95,1.2 1.65,1.2 ; 2.25,-1.5 2.25,-0.8 1.95,-0.8 1.95,-1.5 2.25,-1.5 ; 2.25,1.2 2.25,1.7 2.55,1.7 2.55,1.2 2.25,1.2 ; 2.85,-1.5 2.85,-0.8 2.55,-0.8 2.55,-1.5 2.85,-1.5 ; 2.85,1.2 2.85,1.7 3.15,1.7 3.15,1.2 2.85,1.2 ; 3.45,-1.5 3.45,-0.8 3.15,-0.8 3.15,-1.5 3.45,-1.5 ; 3.775,-0.4 3.775,-1.4 4.225,-1.4 4.225,-0.4 3.775,-0.4